# Altium footprint library EPCOS.PcbLib: 178 footprints (part 4 of 12)
Each footprint in its own frame and in the unit in brackets; x right, y up, seen from the top. Pads: shape width x height; smd on the part's side, far side on the other; paste and mask are expansions set on the pad; w line width, h text height; cw(c..) or ccw(c..) is an arc to the next point about the centre after c.
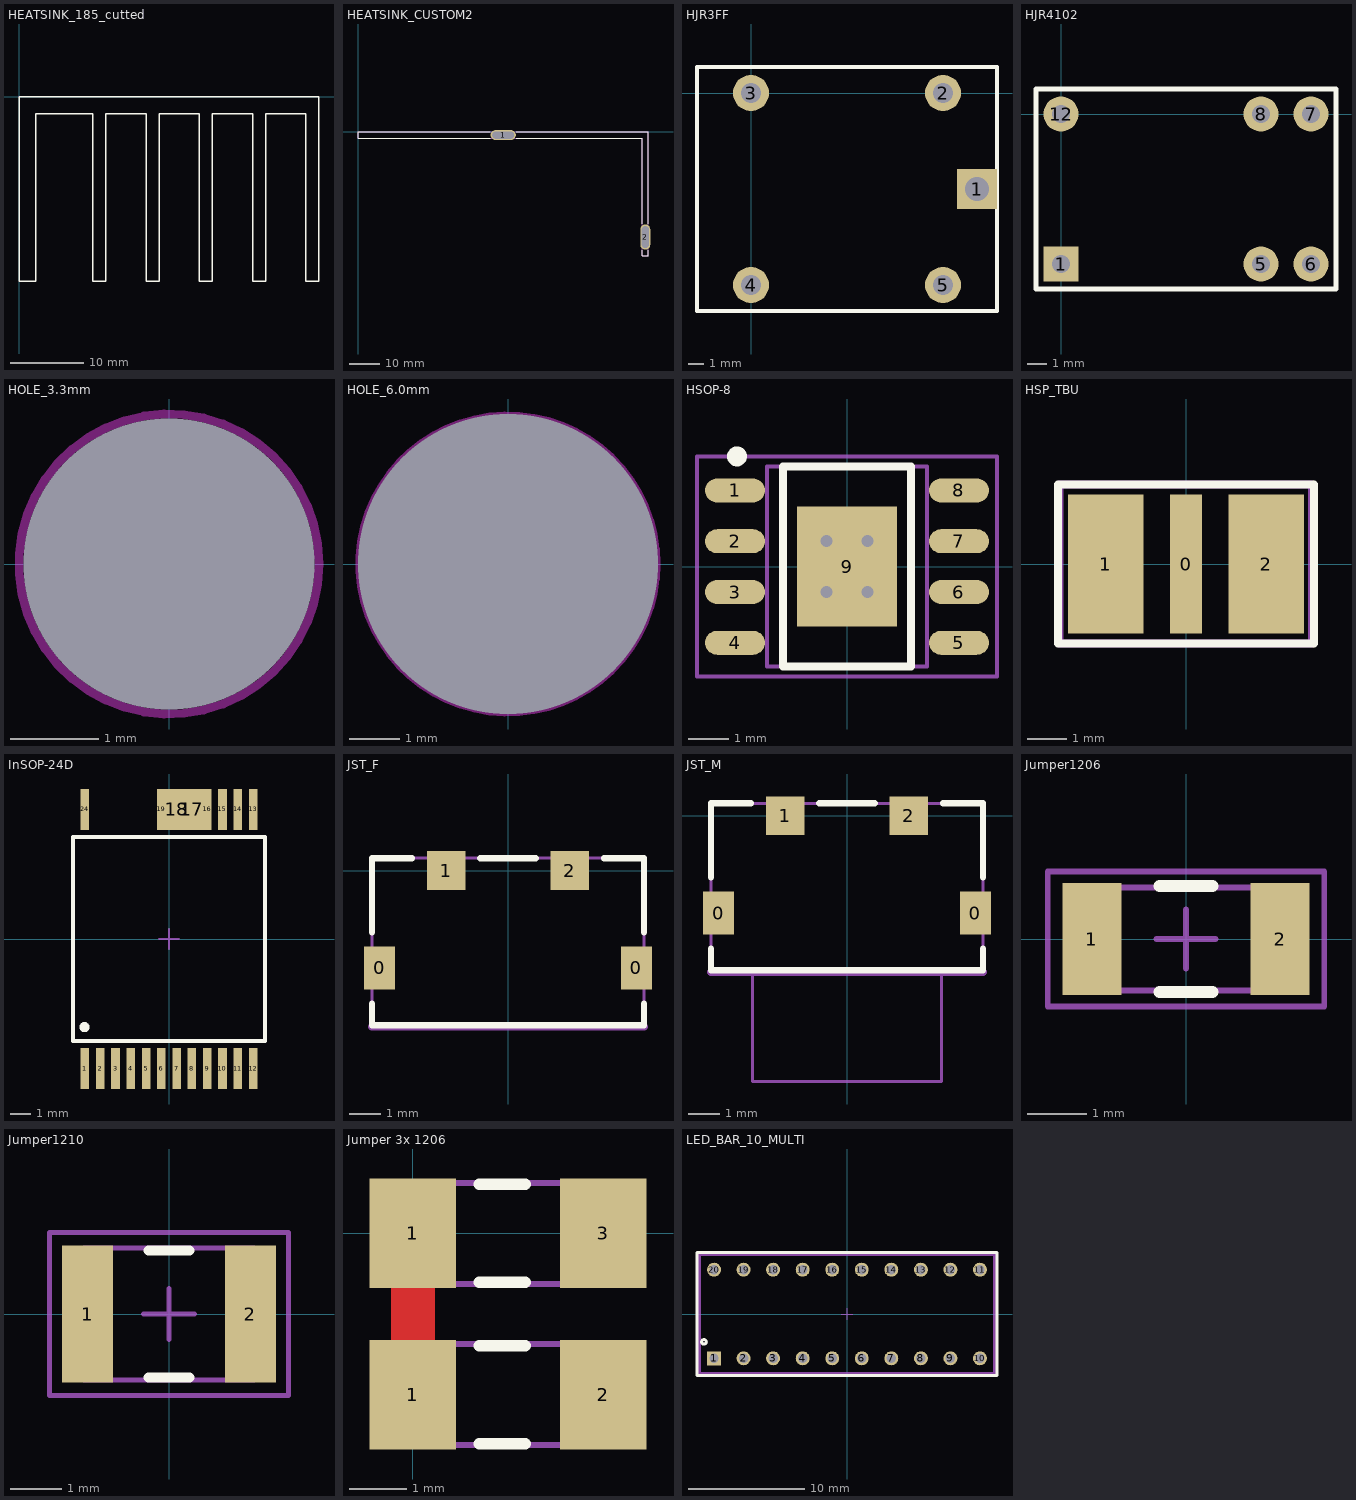
[diagram p3: the footprints below, top view; thin cyan lines are the x and y axes]

## HEATSINK_185_cutted [mm]
height 29.972
Top Overlay:
  lines w0.178: 0,-25.019 2.286,-25.019 2.286,-2.286 10.033,-2.286 10.033,-25.019 11.811,-25.019 11.811,-2.286 17.272,-2.286 17.272,-25.019 19.05,-25.019 19.05,-2.286 24.511,-2.286 24.511,-25.019 26.289,-25.019 26.289,-2.286 31.75,-2.286 31.75,-25.019 33.528,-25.019 33.528,-2.286 38.989,-2.286 38.989,-25.019 40.767,-25.019 40.767,0 0,0 0,-25.019
3D body: height 29.97, standoff 0, extent 0.001,-25.018 40.766,-0.001

## HEATSINK_CUSTOM2 [mm]
height 22
pads (2):
  oval 8.2x3.2 hole 2.3 slot 7 at 0 deg: 1(47,-1)
  oval 3.2x8.2 hole 2.3 slot 7 at 90 deg: 2(93,-34)
Top Overlay:
  lines w0.254: 42.75,-2 0,-2 0,0 42.75,0 ; 51.25,-2 92,-2 92,-29.75 ; 51.25,0 94,0 94,-29.75 ; 92,-38.25 92,-40 94,-40 94,-38.25
Mechanical 13:
  lines w0.254: 0,-2 92,-2 92,-40 94,-40 94,0 0,0 0,-2 ; 44.5,-2 44.5,0 49.5,0 49.5,-2 44.5,-2 ; 92,-36.5 94,-36.5 94,-31.5 92,-31.5 92,-36.5
3D body: height 23, standoff 0, extent 0,-1.999 91.499,-0.001
3D body: height 23, standoff 0, extent 91.501,-31.499 93.999,-0.001
3D body: height 23, standoff -4, extent 92.001,-36.499 93.999,-31.501
3D body: height 23, standoff -4, extent 44.501,-1.999 49.5,0
3D body: height 23, standoff 0, extent 92.001,-39.999 93.999,-36.501
3D body: height 23, standoff -4, extent 92.001,-36.499 93.999,-31.501

## HJR3FF [mil]
height 610
pads (5):
  rect 100x100 hole 59.05: 1(565,-240)
  round 90 hole 51.18: 2(480,0) 3(0,0) 4(0,-480) 5(480,-480)
Top Overlay:
  lines w10: -135,-545 -135,65 615,65 615,-545 -135,-545
3D body "User Library-Tianbo Relay ( HJR-3FF-S-Z).step": height 620.47, standoff -76.77, extent -134.01,-545.12 614.02,65.11

## HJR4102 [mil]
height 433
pads (6):
  rect 70x70 hole 35.43: 1(0,-300)
  round 70 hole 35.43: 5(400,-300) 6(500,-300) 7(500,0) 8(400,0) 12(0,0)
Top Overlay:
  lines w10: -50,-350 550,-350 550,50 -50,50 -50,-350

## HOLE_3.3mm [mm] "Unplated hole 3.3mm"
pads (1):
  round 0 / inner round 6 / far side round 0 hole 3.3 unplated: 1(0,0)
Keep-Out Layer:
  circle w0.1: c0,0 r1.7

## HOLE_6.0mm [mm] "Unplamed hole 6.0mm"
pads (1):
  round 0 / inner round 6 / far side round 0 hole 6 unplated: 1(0,0)
Keep-Out Layer:
  circle w0.1: c0,0 r3

## HQ015_Cover [mm]
height 16.5
3D body "HQ015 Крышка.STEP": height 3, standoff -13.5, extent -75,-58.873 75,59.127

## HSOP-8 [mm]
height 1.73
pads (9):
  oval 1.5x0.6 smd: 1(-2.8,1.905) 2(-2.8,0.635) 3(-2.8,-0.635) 4(-2.8,-1.905) 5(2.8,-1.905) 6(2.8,-0.635) 7(2.8,0.635) 8(2.8,1.905)
  rect 2.489x2.997 smd: 9(0,0)
via 0.508,0.635 diameter 0.7 hole 0.3
via -0.508,0.635 diameter 0.7 hole 0.3
via 0.508,-0.635 diameter 0.7 hole 0.3
via -0.508,-0.635 diameter 0.7 hole 0.3
Top Overlay:
  circle w0.25: c-2.75,2.755 r0.125
  lines w0.2: -1.6,-2.5 1.6,-2.5 1.6,2.5 -1.6,2.5 -1.6,-2.5
Mechanical 13:
  lines w0.1: -2,-2.5 2,-2.5 2,2.5 -2,2.5 -2,-2.5
Mechanical 15:
  lines w0.1: -0.5,0 0.5,0 ; 0,-0.5 0,0.5 ; -3.75,-2.75 3.75,-2.75 3.75,2.75 -3.75,2.75 -3.75,-2.75
3D body "User Library-HSOP-8-DDA.step": height 1.7, standoff 0, extent -3.014,-2.346 3.014,2.346

## HSP_TBU [mm]
height 9.44
pads (3):
  rect 0.8x3.5 smd: 0(0,0)
  rect 1.9x3.5 smd: 1(-2.025,0) 2(2.025,0)
Top Overlay:
  lines w0.2: -3.225,-2 -3.225,2 3.225,2 3.225,-2 -3.225,-2
Mechanical 1:
  lines w0.2: -3.185,-2 -3.185,2 3.175,2 3.175,-2 -3.185,-2
3D body "User Library-Part+Studio+1.STEP": height 1.1, standoff 0.05, extent -3.25,-2 3.25,2

## InSOP-24D [mm]
height 1.6
pads (20):
  rect 0.42x2 smd: 1(-4.125,-6.36) 2(-3.375,-6.36) 3(-2.625,-6.36) 4(-1.875,-6.36) 5(-1.125,-6.36) 6(-0.375,-6.36) 7(0.375,-6.36) 8(1.125,-6.36) 9(1.875,-6.36) 10(2.625,-6.36) 11(3.375,-6.36) 12(4.125,-6.36) 13(4.125,6.36) 14(3.375,6.36) 15(2.625,6.36) 16(1.875,6.36) 19(-0.375,6.36) 24(-4.125,6.36)
  rect 1.2x2 smd: 17(1.125,6.36) 18(0.375,6.36)
Top Overlay:
  circle w0.25: c-4.15,-4.325 r0.125
  lines w0.2: -4.7,-5 -4.7,5 4.7,5 4.7,-5 -4.7,-5
Mechanical 15:
  lines w0.1: -0.5,0 0.5,0 ; 0,-0.5 0,0.5
3D body "User Library-InSOP-24D-1.step": height 1.46, standoff 0, extent -4.71,-6.687 4.71,6.733

## JST_F [mm]
height 4
pads (4):
  rect 1x1.4 smd: 0(-4.15,-3.15) 0(4.15,-3.15)
  rect 1.25x1.25 smd: 1(-2,0) 2(2,0)
Top Overlay:
  lines w0.2: -4.4,-4.3 -4.4,-5 4.4,-5 4.4,-4.3 ; -4.4,-2 -4.4,0.4 -3.1,0.4 ; -0.9,0.4 0.9,0.4 ; 3.1,0.4 4.4,0.4 4.4,-2
Mechanical 13:
  lines w0.1: -4.4,0.3 -4.4,-5 4.4,-5 4.4,0.3 ; -4.4,0.4 4.4,0.4
Mechanical 15:
  lines w0.254: -4.4,-5.05 4.4,-5.05

## JST_M [mm]
height 4
pads (4):
  rect 1x1.4 smd: 0(-4.15,-3.15) 0(4.15,-3.15)
  rect 1.25x1.25 smd: 1(-2,0) 2(2,0)
Top Overlay:
  lines w0.2: -4.4,-4.3 -4.4,-5 4.4,-5 4.4,-4.3 ; -4.4,-2 -4.4,0.4 -3.1,0.4 ; -0.9,0.4 0.9,0.4 ; 3.1,0.4 4.4,0.4 4.4,-2
Mechanical 13:
  lines w0.1: -4.4,0.3 -4.4,-5 4.4,-5 4.4,0.3 ; -4.4,0.4 4.4,0.4 ; -3.05,-5 -3.05,-8.6 3.05,-8.6 3.05,-5
Mechanical 15:
  lines w0.254: -4.4,-5.05 4.4,-5.05

## Jumper1206 [mm]
height 0.762
pads (2):
  rect 1x1.9 smd: 1(-1.6,0) 2(1.6,0)
Top Overlay:
  lines w0.2: -0.45,-0.9 0.45,-0.9 ; -0.45,0.9 0.45,0.9
Mechanical 13:
  lines w0.1: -1.875,-0.875 -1.875,0.875 1.475,0.875 1.475,-0.875 -1.875,-0.875
Mechanical 15:
  lines w0.1: -0.5,0 0.5,0 ; 0,-0.5 0,0.5 ; -2.35,-1.15 2.35,-1.15 2.35,1.15 -2.35,1.15 -2.35,-1.15
3D body "User Library-1206.step": height 0.53, standoff -0.03, extent -1.6,-0.8 1.6,0.8

## Jumper1210 [mm]
height 0.762
pads (2):
  rect 1x2.7 smd: 1(-1.6,0) 2(1.6,0)
Top Overlay:
  lines w0.2: -0.4,-1.25 0.4,-1.25 ; -0.4,1.25 0.4,1.25
Mechanical 13:
  lines w0.1: -1.25,-1.3 -1.25,1.3 ; 1.25,-1.3 1.25,1.3 ; -1.675,-1.3 -1.675,1.3 1.675,1.3 1.675,-1.3 -1.675,-1.3
Mechanical 15:
  lines w0.1: -0.5,0 0.5,0 ; 0,-0.5 0,0.5 ; -2.35,-1.6 -2.35,1.6 2.35,1.6 2.35,-1.6 -2.35,-1.6
3D body "User Library-RESC3225X06N.step": height 0.55, standoff 0, extent -1.6,-1.25 1.6,1.25

## Jumper 3x 1206 [mm]
pads (4):
  rect 1.5x1.9 smd: 1(0,-2.794) 1(0,0) 2(3.302,-2.794) 3(3.302,0)
Top Layer:
  rectangle: -0.381,-1.905 0.381,-0.889
Top Overlay:
  lines w0.2: 1.15,-3.644 1.95,-3.644 ; 1.15,-1.944 1.95,-1.944 ; 1.15,-0.85 1.95,-0.85 ; 1.15,0.85 1.95,0.85
Mechanical 13:
  lines w0.1: -0.125,-3.669 -0.125,-1.919 3.225,-1.919 3.225,-3.669 -0.125,-3.669 ; -0.125,-0.875 3.225,-0.875 3.225,0.875 -0.125,0.875 -0.125,-0.875
3D body: height 0.71, standoff 0, extent -0.125,-0.875 3.225,0.875
3D body: height 0.71, standoff 0, extent -0.125,-3.669 3.225,-1.919

## LED_BAR_10_MULTI [mm]
height 7.9
pads (20):
  rect 1.2x1.2 hole 0.8: 1(-11.43,-3.81)
  round 1.2 hole 0.8: 2(-8.89,-3.81) 3(-6.35,-3.81) 4(-3.81,-3.81) 5(-1.27,-3.81) 6(1.27,-3.81) 7(3.81,-3.81) 8(6.35,-3.81) 9(8.89,-3.81) 10(11.43,-3.81) 11(11.43,3.81) 12(8.89,3.81) 13(6.35,3.81) 14(3.81,3.81) 15(1.27,3.81) 16(-1.27,3.81) 17(-3.81,3.81) 18(-6.35,3.81) 19(-8.89,3.81) 20(-11.43,3.81)
Top Overlay:
  circle w0.254: c-12.3,-2.4 r0.2
  lines w0.254: -12.9,-5.3 -12.9,5.3 12.9,5.3 12.9,-5.3 -12.9,-5.3
Mechanical 15:
  lines w0.1: -0.5,0 0.5,0 ; 0,-0.5 0,0.5
  lines w0.254: -12.7,-5.1 12.7,-5.1 12.7,5.1 -12.7,5.1 -12.7,-5.1
3D body "User Library-10 Segment Bar Graph MultiColor Array.step": height 7.92, standoff -2, extent -12.7,-5 12.7,5.1